# Altium footprint library Gate Driver Board.PcbLib: 117 footprints (part 6 of 8)
Each footprint in its own frame and in the unit in brackets; x right, y up, seen from the top. Pads: shape width x height; smd on the part's side, far side on the other; paste and mask are expansions set on the pad; w line width, h text height; cw(c..) or ccw(c..) is an arc to the next point about the centre after c.
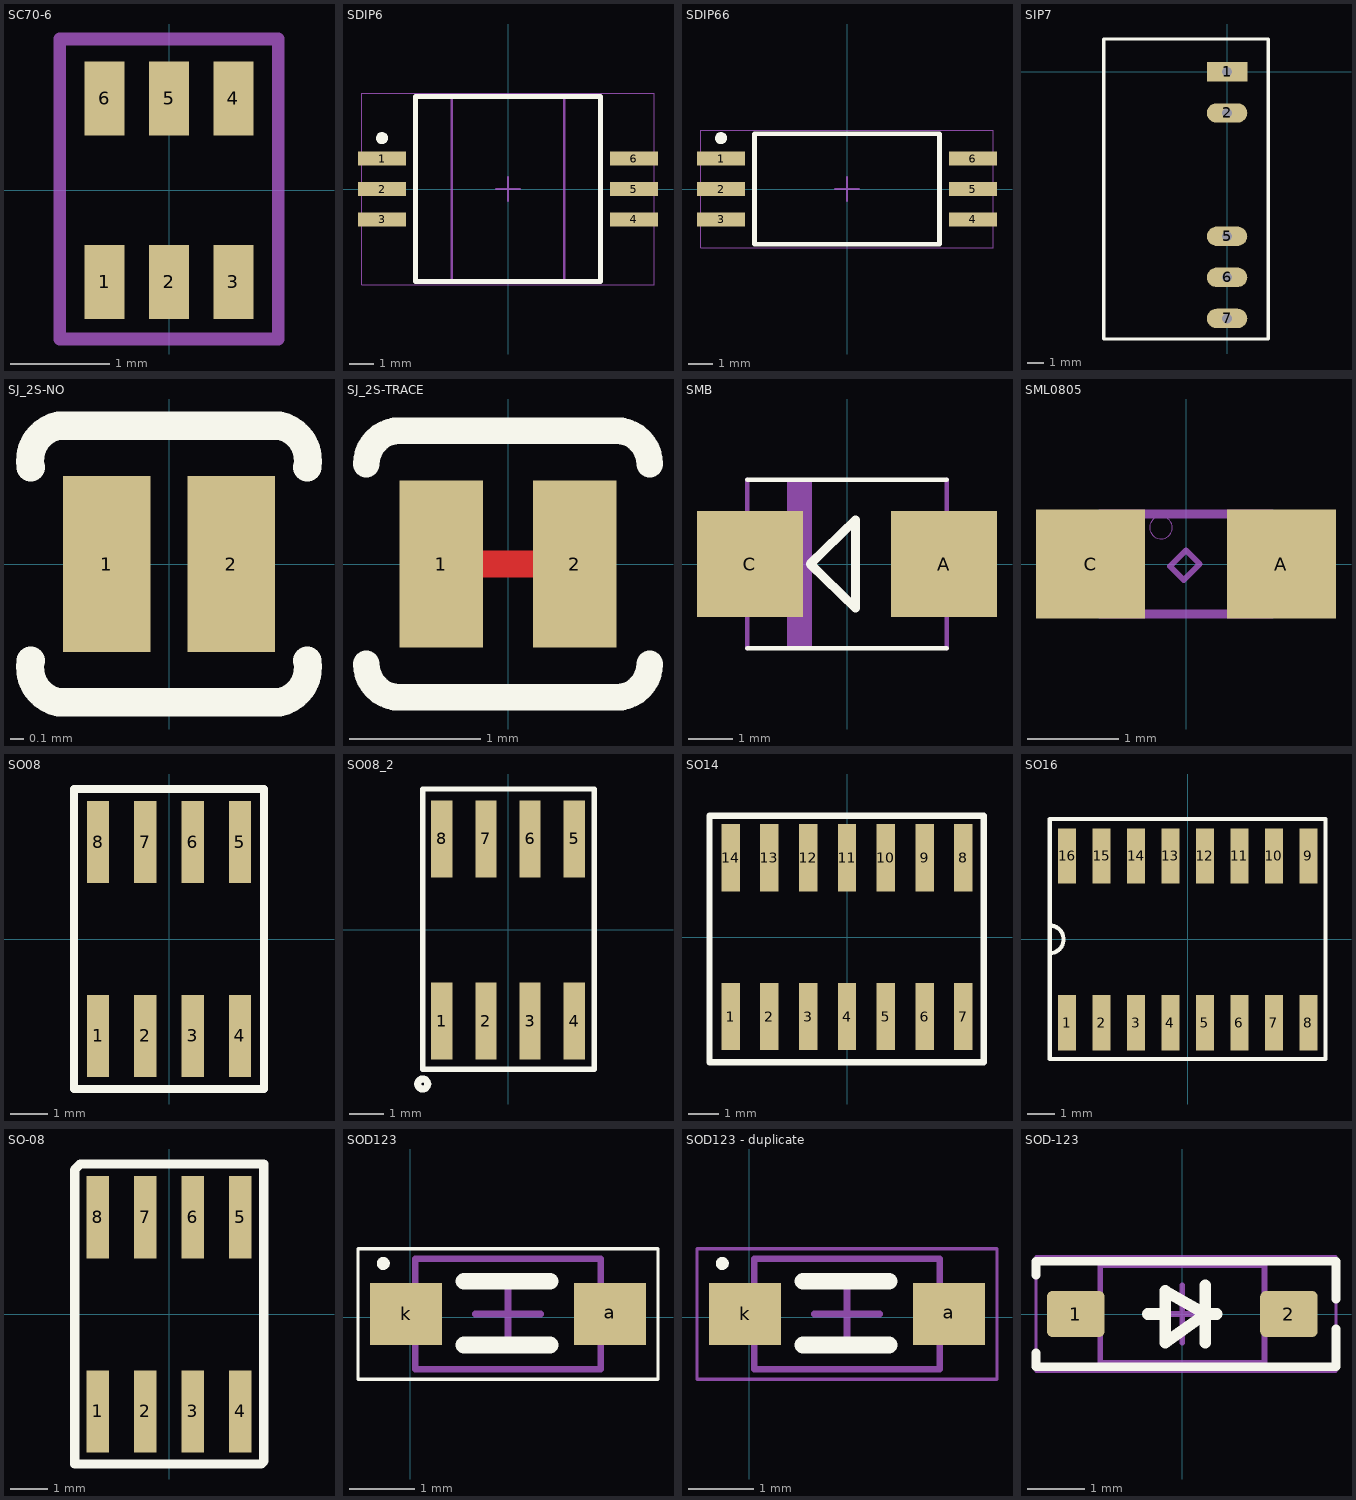
[diagram p5: the footprints below, top view; thin cyan lines are the x and y axes]

## SC70-6 [mm] "SC70-6"
pads (6):
  rect 0.4x0.75 smd paste+0: 1(-0.65,-0.925) 2(0,-0.925) 3(0.65,-0.925) 4(0.65,0.925) 5(0,0.925) 6(-0.65,0.925)
Top Paste:
  region: -0.85,0.55 -0.85,1.3 -0.45,1.3 -0.45,0.55
  region: 0.45,0.55 0.45,1.3 0.85,1.3 0.85,0.55
  region: -0.85,-1.3 -0.85,-0.55 -0.45,-0.55 -0.45,-1.3
  region: -0.2,0.55 -0.2,1.3 0.2,1.3 0.2,0.55
  region: -0.85,-1.3 -0.85,-0.55 -0.45,-0.55 -0.45,-1.3
  region: -0.85,-1.3 -0.85,-0.55 -0.45,-0.55 -0.45,-1.3
  region: -0.201,-1.3 -0.201,-0.55 0.199,-0.55 0.199,-1.3
  region: 0.45,-1.3 0.45,-0.55 0.85,-0.55 0.85,-1.3
Assembly Bottom:
  lines w0.127: -1.1,-1.5 -1.1,1.525 1.1,1.525 1.1,-1.5 -1.1,-1.5
3D body "SC70-6.step": height 1.1, standoff 0, extent -1.025,-1.1 0.975,1

## SDIP6 [mm]
height 2.65
pads (6):
  rect 2x0.6 smd: 1(-5.25,1.27) 2(-5.25,0) 3(-5.25,-1.27) 4(5.25,-1.27) 5(5.25,0) 6(5.25,1.27)
Top Overlay:
  circle w0.25: c-5.25,2.12 r0.125
  lines w0.2: -3.85,-3.85 3.85,-3.85 3.85,3.85 -3.85,3.85 -3.85,-3.85
Assembly Top:
  lines w0.1: -2.35,-3.85 -2.35,3.85 2.35,3.85 2.35,-3.85 -2.35,-3.85
Courtyard Top:
  lines w0.05: -6.1,-4 -6.1,4 6.1,4 6.1,-4 -6.1,-4
  lines w0.1: -0.5,0 0.5,0 ; 0,-0.5 0,0.5
3D body: height 2.65, standoff 0, extent -2.35,-3.85 2.35,3.85

## SDIP66 [mm]
height 2.65
pads (6):
  rect 2x0.6 smd: 1(-5.25,1.27) 2(-5.25,0) 3(-5.25,-1.27) 4(5.25,-1.27) 5(5.25,0) 6(5.25,1.27)
Top Overlay:
  circle w0.25: c-5.25,2.12 r0.125
  lines w0.2: -3.85,-2.3 -3.85,2.3 3.85,2.3 3.85,-2.3 -3.85,-2.3
Assembly Top:
  lines w0.1: -3.85,-2.3 3.85,-2.3 3.85,2.3 -3.85,2.3 -3.85,-2.3
Courtyard Top:
  lines w0.05: -6.1,-2.45 6.1,-2.45 6.1,2.45 -6.1,2.45 -6.1,-2.45
  lines w0.1: -0.5,0 0.5,0 ; 0,-0.5 0,0.5
3D body: height 2.65, standoff 0, extent -3.85,-2.3 3.85,2.3

## SIP7 [mm]
pads (5):
  rect 2.5x1.2 hole 0.6: 1(0,0)
  oval 2.5x1.2 hole 0.6: 2(0,-2.54) 5(0,-10.16) 6(0,-12.7) 7(0,-15.24)
Top Overlay:
  lines w0.2: -7.616,-16.51 2.54,-16.51 2.54,2.032 -7.616,2.032 -7.616,-16.51
3D body "mps_dcdc_mgj2d_sc_a.step": height 11.66, standoff -4.94, extent -7.239,-17.243 2.581,2.257

## SJ_2S-NO [mm] "SJ_2S-NO"
pads (2):
  rect 0.635x1.27 smd paste+0: 1(-0.45,0) 2(0.45,0)
Top Overlay:
  lines w0.203: -1,-0.7 ccw(c-0.75,-0.75) -0.8,-1 0.8,-1 ccw(c0.75,-0.75) 1,-0.7 ; -1,0.7 cw(c-0.75,0.75) -0.8,1 0.8,1 cw(c0.75,0.75) 1,0.7

## SJ_2S-TRACE [mil] "SJ_2S-TRACE"
pads (2):
  rect 25x50 smd paste+0: 1(-20,0) 2(20,0)
Top Layer:
  lines w8: -15,0 15,0
Top Overlay:
  lines w8: -42.5,-30 ccw(c-32.5,-30) -32.5,-40 32.5,-40 ccw(c32.5,-30) 42.5,-30 ; -42.5,30 cw(c-32.5,30) -32.5,40 32.5,40 cw(c32.5,30) 42.5,30

## SMB [mm] "SMB"
pads (2):
  rect 2.4x2.4 smd: A(2.2,0) C(-2.2,0)
Top Overlay:
  lines w0.102: -2.261,-1.905 2.261,-1.905 ; -2.261,1.905 2.261,1.905
  lines w0.203: -0.83,0 0.193,-1 0.193,1 -0.83,0
Assembly Bottom:
  region: -1.35,-1.9 -1.35,1.9 -0.8,1.9 -0.8,-1.9
  region: 2.261,-1.092 2.261,1.092 2.794,1.092 2.794,-1.092
  region: -2.794,-1.092 -2.794,1.092 -2.261,1.092 -2.261,-1.092
  lines w0.102: -2.261,-1.905 -2.261,1.905 ; 2.261,-1.905 2.261,1.905

## SML0805 [mm] "SML0805"
pads (2):
  rect 1.2x1.2 smd: A(1.05,0) C(-1.05,0)
Assembly Bottom:
  lines w0.102: -0.95,-0.55 -0.95,0.55 0.95,0.55 0.95,-0.55 -0.95,-0.55
3D Body Bottom:
  circle w0: c-0.275,0.4 r0.125
  lines w0.064: -0.175,-0.025 -0.025,-0.175 0.15,0 0,0.15 -0.175,-0.025

## SO08 [mm] "SO08"
pads (8):
  rect 0.6x2.2 smd: 1(-1.905,-2.6) 2(-0.635,-2.6) 3(0.635,-2.6) 4(1.905,-2.6) 5(1.905,2.6) 6(0.635,2.6) 7(-0.635,2.6) 8(-1.905,2.6)
Top Overlay:
  lines w0.203: -2.55,-4.025 2.55,-4.025 2.55,-1.25 2.55,4.025 -2.55,4.025 -2.55,-1.25 -2.55,-4.025
Assembly Bottom:
  region: -2.15,2 -2.15,3.1 -1.66,3.1 -1.66,2
  region: -0.88,2 -0.88,3.1 -0.39,3.1 -0.39,2
  region: 0.39,2 0.39,3.1 0.88,3.1 0.88,2
  region: 1.66,2 1.66,3.1 2.15,3.1 2.15,2
  region: 1.66,-3.1 1.66,-2 2.15,-2 2.15,-3.1
  region: 0.39,-3.1 0.39,-2 0.88,-2 0.88,-3.1
  region: -0.88,-3.1 -0.88,-2 -0.39,-2 -0.39,-3.1
  region: -2.15,-3.1 -2.15,-2 -1.66,-2 -1.66,-3.1
3D body "SOIC08 narrow.stp": height 2, standoff 0, extent -2.45,-3.032 2.55,3.132

## SO08_2 [mil]
pads (8):
  rect 24x87 smd: 1(-75,-103) 2(-25,-103) 3(25,-103) 4(75,-103) 5(75,103) 6(25,103) 7(-25,103) 8(-75,103)
Top Overlay:
  circle w8: c-96.46,-174.21 r5.65
  lines w6: -96.46,-157.48 97.44,-157.48 97.44,159.45 -96.46,159.45 -96.46,-157.48
Assembly Bottom:
  region: -82,-113 -82,-73 -68,-73 -68,-113
  region: -32,-113 -32,-73 -18,-73 -18,-113
  region: 18,-113 18,-73 32,-73 32,-113
  region: 68,-113 68,-73 82,-73 82,-113
  region: -82,73 -82,113 -68,113 -68,73
  region: -32,73 -32,113 -18,113 -18,73
  region: 18,73 18,113 32,113 32,73
  region: 68,73 68,113 82,113 82,73
3D body "SOIC08 narrow.stp": height 69.4, standoff -9.21, extent -99.41,-119.35 97.44,123.29

## SO14 [mm] "SO14"
pads (14):
  rect 0.6x2.2 smd: 1(-3.81,-2.6) 2(-2.54,-2.6) 3(-1.27,-2.6) 4(0,-2.6) 5(1.27,-2.6) 6(2.54,-2.6) 7(3.81,-2.6) 8(3.81,2.6) 9(2.54,2.6) 10(1.27,2.6) 11(0,2.6) 12(-1.27,2.6) 13(-2.54,2.6) 14(-3.81,2.6)
Top Overlay:
  lines w0.203: -4.5,-4.1 4.475,-4.1 4.475,3.975 -4.5,3.975 -4.5,-4.1
Assembly Bottom:
  region: 1.025,2 1.025,3.1 1.515,3.1 1.515,2
  region: 2.295,2 2.295,3.1 2.785,3.1 2.785,2
  region: 3.565,2 3.565,3.1 4.055,3.1 4.055,2
  region: 3.565,-3.1 3.565,-2 4.055,-2 4.055,-3.1
  region: 2.295,-3.1 2.295,-2 2.785,-2 2.785,-3.1
  region: 1.025,-3.1 1.025,-2 1.515,-2 1.515,-3.1
  region: -4.055,2 -4.055,3.1 -3.565,3.1 -3.565,2
  region: -2.785,2 -2.785,3.1 -2.295,3.1 -2.295,2
  region: -1.515,2 -1.515,3.1 -1.025,3.1 -1.025,2
  region: -0.245,2 -0.245,3.1 0.245,3.1 0.245,2
  region: -0.245,-3.1 -0.245,-2 0.245,-2 0.245,-3.1
  region: -1.515,-3.1 -1.515,-2 -1.025,-2 -1.025,-3.1
  region: -2.785,-3.1 -2.785,-2 -2.295,-2 -2.295,-3.1
  region: -4.055,-3.1 -4.055,-2 -3.565,-2 -3.565,-3.1
3D body "SOIC14 narrow.stp": height 2, standoff 0, extent -4.405,-3.107 4.405,3.057

## SO16 [mil] "SO16"
pads (16):
  rect 26x80 smd: 1(-175,-121) 2(-125,-121) 3(-75,-121) 4(-25,-121) 5(25,-121) 6(75,-121) 7(125,-121) 8(175,-121) 9(175,121) 10(125,121) 11(75,121) 12(25,121) 13(-25,121) 14(-75,121) 15(-125,121) 16(-175,121)
Top Overlay:
  lines w6: -200,-20 ccw(c-200,0) -200,20 ; 200,-77 200,77 ; -200,-173.46 -200,-77 -200,174.44 200,174.44 200,-173.46 -183.03,-173.46 -200,-173.46
3D body "SOIC16 narrow.stp": height 78.74, standoff 0.13, extent -200.39,-122.31 196.46,120.34

## SO-08 [mm] "SO-08"
pads (8):
  rect 0.6x2.2 smd: 1(-1.905,-2.6) 2(-0.635,-2.6) 3(0.635,-2.6) 4(1.905,-2.6) 5(1.905,2.6) 6(0.635,2.6) 7(-0.635,2.6) 8(-1.905,2.6)
Top Overlay:
  lines w0.254: -2.525,-4.01 -2.1,-4.01 2.465,-4.01 2.533,-3.942 2.533,4.025 -2.375,4.025 -2.525,3.875 -2.525,-3.775 -2.525,-4.01
Assembly Bottom:
  region: -2.15,2 -2.15,3.1 -1.66,3.1 -1.66,2
  region: -0.88,2 -0.88,3.1 -0.39,3.1 -0.39,2
  region: 0.39,2 0.39,3.1 0.88,3.1 0.88,2
  region: 1.66,2 1.66,3.1 2.15,3.1 2.15,2
  region: 1.66,-3.1 1.66,-2 2.15,-2 2.15,-3.1
  region: 0.39,-3.1 0.39,-2 0.88,-2 0.88,-3.1
  region: -0.88,-3.1 -0.88,-2 -0.39,-2 -0.39,-3.1
  region: -2.15,-3.1 -2.15,-2 -1.66,-2 -1.66,-3.1
3D body: height 1.27, standoff 0, extent 1.605,1.5 2.205,3.7
3D body: height 1.27, standoff 0, extent 0.335,1.5 0.935,3.7
3D body: height 1.27, standoff 0, extent -2.205,1.5 -1.605,3.7
3D body: height 1.27, standoff 0, extent 1.605,-3.7 2.205,-1.5
3D body: height 1.27, standoff 0, extent 0.335,-3.7 0.935,-1.5
3D body: height 1.27, standoff 0, extent -2.205,-3.7 -1.605,-1.5
3D body: height 1.27, standoff 0, extent -0.935,1.5 -0.335,3.7
3D body: height 1.27, standoff 0, extent -0.935,-3.7 -0.335,-1.5
3D body: height 3.81, standoff 0, extent -2.15,2 -1.66,3.1
3D body: height 3.81, standoff 0, extent -0.88,2 -0.39,3.1
3D body: height 3.81, standoff 0, extent 0.39,2 0.88,3.1
3D body: height 3.81, standoff 0, extent 1.66,2 2.15,3.1
3D body: height 3.81, standoff 0, extent 1.66,-3.1 2.15,-2
3D body: height 3.81, standoff 0, extent 0.39,-3.1 0.88,-2
3D body: height 3.81, standoff 0, extent -0.88,-3.1 -0.39,-2
3D body: height 3.81, standoff 0, extent -2.15,-3.1 -1.66,-2
3D body "SOIC08 narrow.stp": height 2, standoff 0, extent 3.243,-1.675 9.407,3.325

## SOD123 [mm]
height 1.35
pads (2):
  rect 1.1x0.95 smd: a(3.063,0.05) k(-0.062,0.05)
Top Overlay:
  circle w0.1: c-0.412,0.825 r0.05
  lines w0.05: -0.8,-0.95 3.8,-0.95 3.8,1.05 -0.8,1.05 -0.8,-0.95
  lines w0.254: 0.825,-0.425 2.15,-0.425 ; 0.825,0.55 2.15,0.55
Assembly Top:
  lines w0.1: 0.075,-0.8 2.925,-0.8 2.925,0.9 0.075,0.9 0.075,-0.8
Courtyard Top:
  lines w0.1: 1,0.05 2,0.05 ; 1.5,-0.45 1.5,0.55
3D body "CircuitWorks-SOD123.STEP": height 1.28, standoff 0.01, extent -0.375,-0.775 3.325,0.825

## SOD123 - duplicate [mm]
height 1.35
pads (2):
  rect 1.1x0.95 smd: a(3.063,0.05) k(-0.062,0.05)
Top Overlay:
  circle w0.1: c-0.412,0.825 r0.05
  lines w0.254: 0.825,-0.425 2.15,-0.425 ; 0.825,0.55 2.15,0.55
Assembly Top:
  lines w0.1: 0.075,-0.8 0.075,0.9 2.925,0.9 2.925,-0.8 0.075,-0.8
Courtyard Top:
  lines w0.05: -0.8,-0.95 -0.8,1.05 3.8,1.05 3.8,-0.95 -0.8,-0.95
  lines w0.1: 1,0.05 2,0.05 ; 1.5,-0.45 1.5,0.55
3D body "CircuitWorks-SOD123.STEP": height 1.28, standoff 0.01, extent -0.375,-0.775 3.325,0.825

## SOD-123 [mm] "SOD, 2-Leads, Body 1.55x3.70mm, IPC Medium Density"
height 1.35
pads (2):
  rrect25% 1x0.8 smd: 1(-1.85,0) 2(1.85,0)
Top Overlay:
  lines w0.15: -2.54,-0.675 -2.54,-0.916 2.286,-0.916 2.667,-0.916 2.667,-0.254 ; -2.54,0.675 -2.54,0.916 2.286,0.916 2.667,0.916 2.667,0.254
  lines w0.2: -0.6,0 -0.3,0 ; 0.4,-0.5 0.4,0.5 ; 0.6,0 0.4,0 ; 0.4,0 -0.3,-0.5 -0.3,0.4 0.4,0
Mechanical 13:
  lines w0.1: -1.425,-0.85 1.425,-0.85 1.425,0.85 -1.425,0.85 -1.425,-0.85
Mechanical 15:
  lines w0.05: -2.54,-1 2.667,-1 2.667,1 -2.54,1 -2.54,-1
  lines w0.1: -0.5,0 0.5,0 ; 0,-0.5 0,0.5
3D body "SOD123.STEP": height 1.18, standoff 0, extent -1.95,-0.9 1.95,0.9